# Altium footprint library 3.22-杂项.PcbLib: 985 footprints (part 39 of 64)
Each footprint in its own frame and in the unit in brackets; x right, y up, seen from the top. Pads: shape width x height; smd on the part's side, far side on the other; paste and mask are expansions set on the pad; w line width, h text height; cw(c..) or ccw(c..) is an arc to the next point about the centre after c.
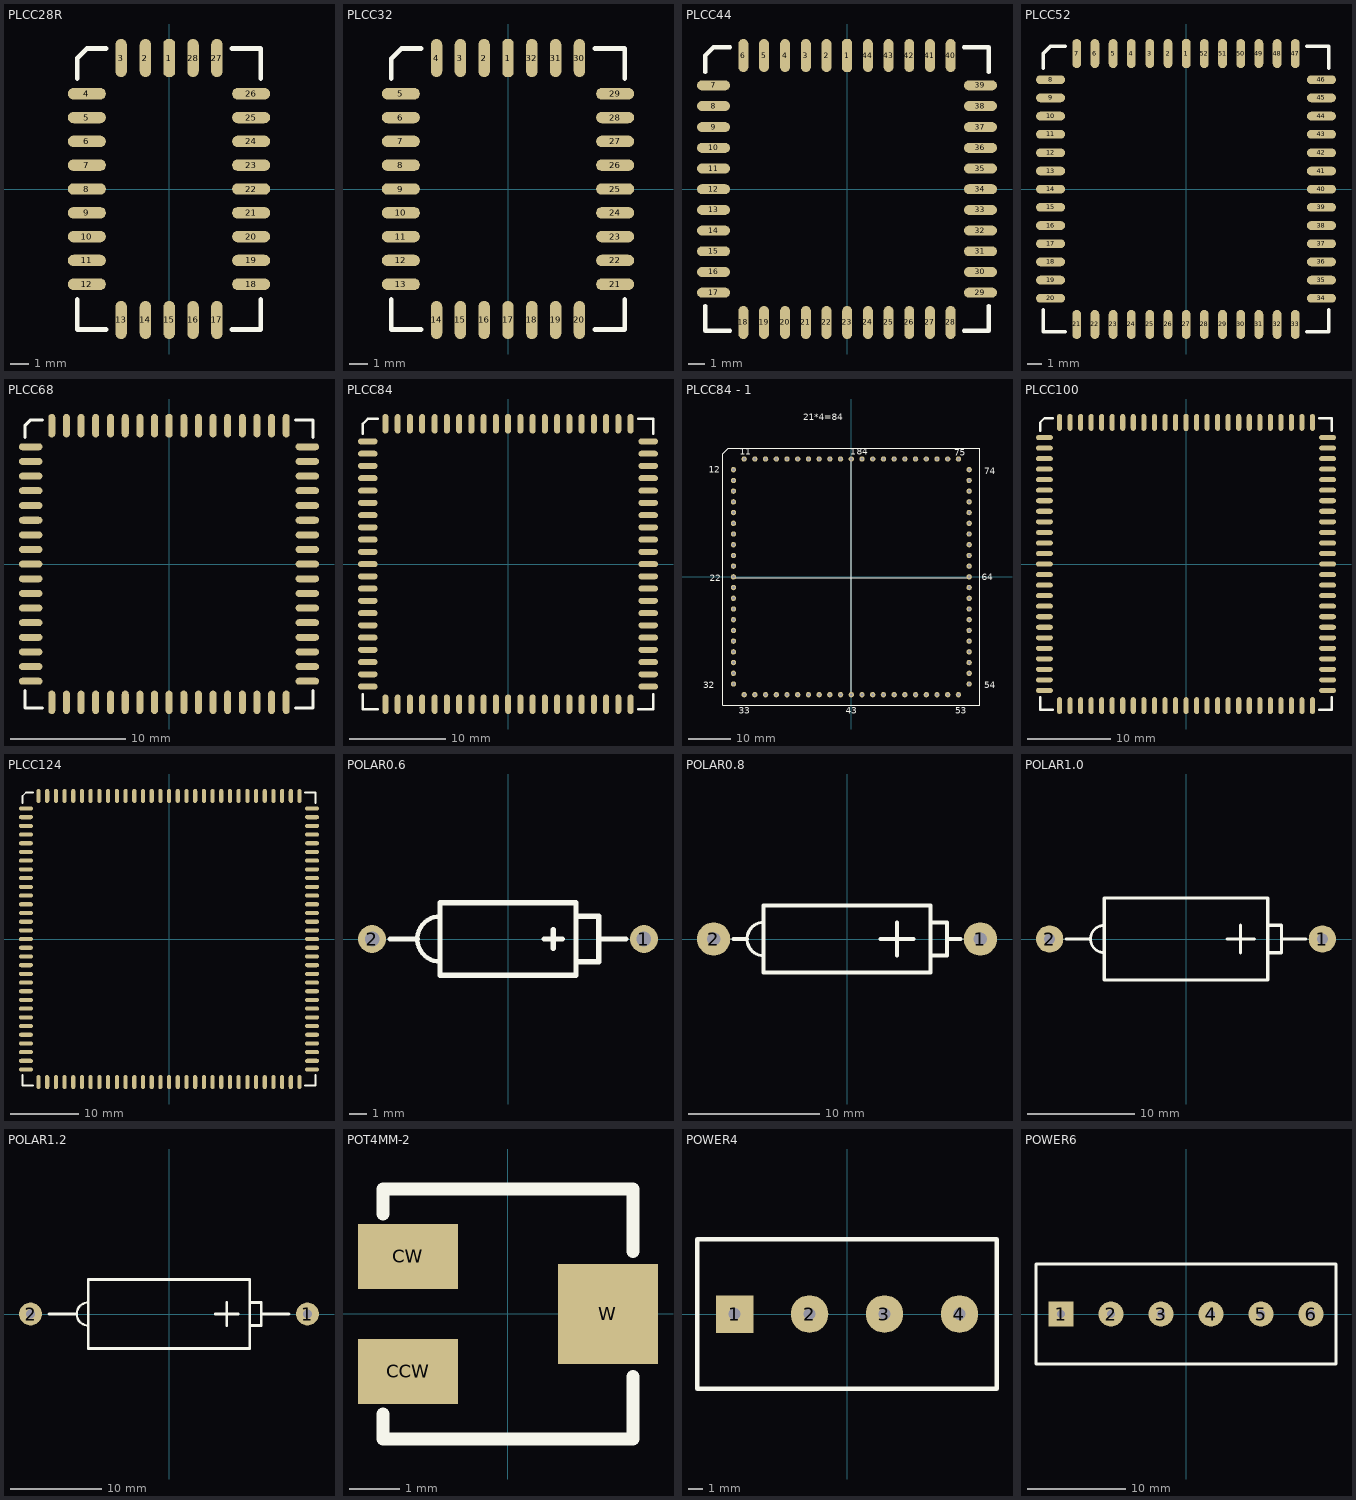
[diagram p38: the footprints below, top view; thin cyan lines are the x and y axes]

## PLCC28R [mil]
pads (28):
  oct 24x80 smd: 1(0.5,275)
  oval 24x80 smd: 2(-49.5,275) 3(-100.5,275) 13(-100.5,-275) 14(-49.5,-275) 15(0.5,-275) 16(50.5,-275) 17(100.5,-275) 27(100.5,275) 28(50.5,275)
  oval 80x24 smd: 4(-172.5,200) 5(-172.5,150) 6(-172.5,100) 7(-172.5,50) 8(-172.5,0) 9(-172.5,-50) 10(-172.5,-100) 11(-172.5,-150) 12(-172.5,-200) 18(172.5,-200) 19(172.5,-150) 20(172.5,-100) 21(172.5,-50) 22(172.5,0) 23(172.5,50) 24(172.5,100) 25(172.5,150) 26(172.5,200)
Top Overlay:
  lines w10: -192.5,-232 -192.5,-295 -132.5,-295 ; -192.5,232 -192.5,275 -172.5,295 -132.5,295 ; 132.5,-295 192.5,-295 192.5,-232 ; 132.5,295 192.5,295 192.5,232

## PLCC32 [mil]
pads (32):
  oct 24x80 smd: 1(0,275)
  oval 24x80 smd: 2(-50,275) 3(-100,275) 4(-150,275) 14(-150,-275) 15(-100,-275) 16(-50,-275) 17(0,-275) 18(50,-275) 19(100,-275) 20(150,-275) 30(150,275) 31(100,275) 32(50,275)
  oval 80x24 smd: 5(-225,200) 6(-225,150) 7(-225,100) 8(-225,50) 9(-225,0) 10(-225,-50) 11(-225,-100) 12(-225,-150) 13(-225,-200) 21(225,-200) 22(225,-150) 23(225,-100) 24(225,-50) 25(225,0) 26(225,50) 27(225,100) 28(225,150) 29(225,200)
Top Overlay:
  lines w10: -245,-232 -245,-295 -182,-295 ; -245,232 -245,274 -224,295 -182,295 ; 182,-295 245,-295 245,-232 ; 182,295 245,295 245,232

## PLCC44 [mil]
pads (44):
  oct 24x80 smd: 1(0.5,322.5)
  oval 24x80 smd: 2(-49.5,322.5) 3(-99.5,322.5) 4(-149.5,322.5) 5(-200.5,322.5) 6(-250.5,322.5) 18(-250.5,-322.5) 19(-200.5,-322.5) 20(-149.5,-322.5) 21(-99.5,-322.5) 22(-49.5,-322.5) 23(0.5,-322.5) 24(50.5,-322.5) 25(100.5,-322.5) 26(150.5,-322.5) 27(200.5,-322.5) 28(250.5,-322.5) 40(250.5,322.5) 41(200.5,322.5) 42(150.5,322.5) 43(100.5,322.5) 44(50.5,322.5)
  oval 80x24 smd: 7(-322.5,250.5) 8(-322.5,200.5) 9(-322.5,149.5) 10(-322.5,99.5) 11(-322.5,49.5) 12(-322.5,-0.5) 13(-322.5,-50.5) 14(-322.5,-100.5) 15(-322.5,-150.5) 16(-322.5,-200.5) 17(-322.5,-250.5) 29(322.5,-250.5) 30(322.5,-200.5) 31(322.5,-150.5) 32(322.5,-100.5) 33(322.5,-50.5) 34(322.5,-0.5) 35(322.5,49.5) 36(322.5,99.5) 37(322.5,149.5) 38(322.5,200.5) 39(322.5,250.5)
Top Overlay:
  lines w10: -342.5,-282.5 -342.5,-342.5 -282.5,-342.5 ; -342.5,282.5 -342.5,322.5 -322.5,342.5 -282.5,342.5 ; 282.5,-342.5 342.5,-342.5 342.5,-282.5 ; 282.5,342.5 342.5,342.5 342.5,282.5

## PLCC52 [mil]
pads (52):
  oct 24x80 smd: 1(0.5,372.5)
  oval 24x80 smd: 2(-49.5,372.5) 3(-99.5,372.5) 4(-150.5,372.5) 5(-200.5,372.5) 6(-250.5,372.5) 7(-300.5,372.5) 21(-300.5,-372.5) 22(-250.5,-372.5) 23(-200.5,-372.5) 24(-150.5,-372.5) 25(-99.5,-372.5) 26(-49.5,-372.5) 27(0.5,-372.5) 28(50.5,-372.5) 29(100.5,-372.5) 30(150.5,-372.5) 31(200.5,-372.5) 32(250.5,-372.5) 33(300.5,-372.5) 47(300.5,372.5) 48(250.5,372.5) 49(200.5,372.5) 50(150.5,372.5) 51(100.5,372.5) 52(50.5,372.5)
  oval 80x24 smd: 8(-372.5,300.5) 9(-372.5,250.5) 10(-372.5,200.5) 11(-372.5,150.5) 12(-372.5,99.5) 13(-372.5,49.5) 14(-372.5,-0.5) 15(-372.5,-50.5) 16(-372.5,-100.5) 17(-372.5,-150.5) 18(-372.5,-200.5) 19(-372.5,-250.5) 20(-372.5,-300.5) 34(372.5,-300.5) 35(372.5,-250.5) 36(372.5,-200.5) 37(372.5,-150.5) 38(372.5,-100.5) 39(372.5,-50.5) 40(372.5,-0.5) 41(372.5,49.5) 42(372.5,99.5) 43(372.5,150.5) 44(372.5,200.5) 45(372.5,250.5) 46(372.5,300.5)
Top Overlay:
  lines w10: -392.5,-332.5 -392.5,-392.5 -332.5,-392.5 ; -392.5,332.5 -392.5,372.5 -372.5,392.5 -332.5,392.5 ; 332.5,-392.5 392.5,-392.5 392.5,-332.5 ; 332.5,392.5 392.5,392.5 392.5,332.5

## PLCC68 [mil]
pads (68):
  oct 24x80 smd: 1(0.5,472.5)
  oval 24x80 smd: 2(-49.5,472.5) 3(-99.5,472.5) 4(-149.5,472.5) 5(-199.5,472.5) 6(-250.5,472.5) 7(-300.5,472.5) 8(-350.5,472.5) 9(-400.5,472.5) 27(-400.5,-472.5) 28(-350.5,-472.5) 29(-300.5,-472.5) 30(-250.5,-472.5) 31(-199.5,-472.5) 32(-149.5,-472.5) 33(-99.5,-472.5) 34(-49.5,-472.5) 35(0.5,-472.5) 36(50.5,-472.5) 37(100.5,-472.5) 38(150.5,-472.5) 39(200.5,-472.5) 40(250.5,-472.5) 41(300.5,-472.5) 42(350.5,-472.5) 43(400.5,-472.5) 61(400.5,472.5) 62(350.5,472.5) 63(300.5,472.5) 64(250.5,472.5) 65(200.5,472.5) 66(150.5,472.5) 67(100.5,472.5) 68(50.5,472.5)
  oval 80x24 smd: 10(-472.5,400.5) 11(-472.5,350.5) 12(-472.5,300.5) 13(-472.5,250.5) 14(-472.5,199.5) 15(-472.5,149.5) 16(-472.5,99.5) 17(-472.5,49.5) 18(-472.5,-0.5) 19(-472.5,-50.5) 20(-472.5,-100.5) 21(-472.5,-150.5) 22(-472.5,-200.5) 23(-472.5,-250.5) 24(-472.5,-300.5) 25(-472.5,-350.5) 26(-472.5,-400.5) 44(472.5,-400.5) 45(472.5,-350.5) 46(472.5,-300.5) 47(472.5,-250.5) 48(472.5,-200.5) 49(472.5,-150.5) 50(472.5,-100.5) 51(472.5,-50.5) 52(472.5,-0.5) 53(472.5,49.5) 54(472.5,99.5) 55(472.5,149.5) 56(472.5,199.5) 57(472.5,250.5) 58(472.5,300.5) 59(472.5,350.5) 60(472.5,400.5)
Top Overlay:
  lines w10: -492.5,-432.5 -492.5,-492.5 -432.5,-492.5 ; -492.5,432.5 -492.5,472.5 -472.5,492.5 -432.5,492.5 ; 432.5,-492.5 492.5,-492.5 492.5,-432.5 ; 432.5,492.5 492.5,492.5 492.5,432.5

## PLCC84 [mil]
pads (84):
  oct 24x80 smd: 1(0.5,572.5)
  oval 24x80 smd: 2(-49.5,572.5) 3(-99.5,572.5) 4(-149.5,572.5) 5(-199.5,572.5) 6(-249.5,572.5) 7(-299.5,572.5) 8(-350.5,572.5) 9(-400.5,572.5) 10(-450.5,572.5) 11(-500.5,572.5) 33(-500.5,-572.5) 34(-450.5,-572.5) 35(-400.5,-572.5) 36(-350.5,-572.5) 37(-299.5,-572.5) 38(-249.5,-572.5) 39(-199.5,-572.5) 40(-149.5,-572.5) 41(-99.5,-572.5) 42(-49.5,-572.5) 43(0.5,-572.5) 44(50.5,-572.5) 45(100.5,-572.5) 46(150.5,-572.5) 47(200.5,-572.5) 48(250.5,-572.5) 49(300.5,-572.5) 50(350.5,-572.5) 51(400.5,-572.5) 52(450.5,-572.5) 53(500.5,-572.5) 75(500.5,572.5) 76(450.5,572.5) 77(400.5,572.5) 78(350.5,572.5) 79(300.5,572.5) 80(250.5,572.5) 81(200.5,572.5) 82(150.5,572.5) 83(100.5,572.5) 84(50.5,572.5)
  oval 80x24 smd: 12(-572.5,500.5) 13(-572.5,450.5) 14(-572.5,400.5) 15(-572.5,350.5) 16(-572.5,299.5) 17(-572.5,249.5) 18(-572.5,199.5) 19(-572.5,149.5) 20(-572.5,99.5) 21(-572.5,49.5) 22(-572.5,-0.5) 23(-572.5,-50.5) 24(-572.5,-100.5) 25(-572.5,-150.5) 26(-572.5,-200.5) 27(-572.5,-250.5) 28(-572.5,-300.5) 29(-572.5,-350.5) 30(-572.5,-400.5) 31(-572.5,-450.5) 32(-572.5,-500.5) 54(572.5,-500.5) 55(572.5,-450.5) 56(572.5,-400.5) 57(572.5,-350.5) 58(572.5,-300.5) 59(572.5,-250.5) 60(572.5,-200.5) 61(572.5,-150.5) 62(572.5,-100.5) 63(572.5,-50.5) 64(572.5,-0.5) 65(572.5,49.5) 66(572.5,99.5) 67(572.5,149.5) 68(572.5,199.5) 69(572.5,249.5) 70(572.5,299.5) 71(572.5,350.5) 72(572.5,400.5) 73(572.5,450.5) 74(572.5,500.5)
Top Overlay:
  lines w10: -592.5,-532.5 -592.5,-592.5 -532.5,-592.5 ; -592.5,532.5 -592.5,572.5 -572.5,592.5 -532.5,592.5 ; 532.5,-592.5 592.5,-592.5 592.5,-532.5 ; 532.5,592.5 592.5,592.5 592.5,532.5

## PLCC84 - 1 [mil] "PLCC84脚芯片"
pads (84):
  round 50 hole 25: 1(0,-1100) 1(0,1100) 1(1000,-1100) 1(1000,1100) 1(1100,-1000) 1(1100,0) 2(-100,-1100) 2(-100,1100) 2(900,-1100) 2(900,1100) 2(1100,-900) 2(1100,100) 3(-200,-1100) 3(-200,1100) 3(800,-1100) 3(800,1100) 3(1100,-800) 3(1100,200) 4(-300,-1100) 4(-300,1100) 4(700,-1100) 4(700,1100) 4(1100,-700) 4(1100,300) 5(-400,-1100) 5(-400,1100) 5(600,-1100) 5(600,1100) 5(1100,-600) 5(1100,400) 6(-500,-1100) 6(-500,1100) 6(500,-1100) 6(500,1100) 6(1100,-500) 6(1100,500) 7(-600,-1100) 7(-600,1100) 7(400,-1100) 7(400,1100) 7(1100,-400) 7(1100,600) 8(-700,-1100) 8(-700,1100) 8(300,-1100) 8(300,1100) 8(1100,-300) 8(1100,700) 9(-800,-1100) 9(-800,1100) 9(200,-1100) 9(200,1100) 9(1100,-200) 9(1100,800) 10(-900,-1100) 10(-900,1100) 10(100,-1100) 10(100,1100) 10(1100,-100) 10(1100,900) 11(-1000,-1100) 11(-1000,1100) 12(-1100,1000) 13(-1100,900) 14(-1100,800) 14(1100,1000) 15(-1100,700) 16(-1100,600) 17(-1100,500) 18(-1100,400) 19(-1100,300) 20(-1100,200) 21(-1100,100) 22(-1100,0) 23(-1100,-100) 24(-1100,-200) 25(-1100,-300) 26(-1100,-400) 27(-1100,-500) 28(-1100,-600) 29(-1100,-700) 30(-1100,-800) 31(-1100,-900) 32(-1100,-1000)
Top Overlay:
  lines w10: -1100,-10 1100,-10 ; 0,-1100 0,1100 ; -1200,-1200 -1200,1150 -1150,1200 1200,1200 1200,-1200 -1200,-1200
  text "64" at 1220,-30 h60
  text "43" at -50,-1280 h60
  text "22" at -1320,-40 h60
  text "84" at 50,1140 h60
  text "75" at 960,1130 h60
  text "74" at 1240,960 h60
  text "54" at 1240,-1040 h60
  text "53" at 970,-1280 h60
  text "33" at -1050,-1280 h60
  text "1" at -10,1140 h60
  text "11" at -1040,1140 h60
  text "12" at -1330,970 h60
  text "32" at -1380,-1040 h60
  text "21*4=84" at -450,1460 h60

## PLCC100 [mil]
pads (100):
  oct 24x80 smd: 1(0.5,672.5)
  oval 24x80 smd: 2(-49.5,672.5) 3(-99.5,672.5) 4(-149.5,672.5) 5(-200.5,672.5) 6(-250.5,672.5) 7(-300.5,672.5) 8(-350.5,672.5) 9(-400.5,672.5) 10(-450.5,672.5) 11(-500.5,672.5) 12(-550.5,672.5) 13(-600.5,672.5) 39(-600.5,-672.5) 40(-550.5,-672.5) 41(-500.5,-672.5) 42(-450.5,-672.5) 43(-400.5,-672.5) 44(-350.5,-672.5) 45(-300.5,-672.5) 46(-250.5,-672.5) 47(-200.5,-672.5) 48(-149.5,-672.5) 49(-99.5,-672.5) 50(-49.5,-672.5) 51(0.5,-672.5) 52(50.5,-672.5) 53(100.5,-672.5) 54(150.5,-672.5) 55(200.5,-672.5) 56(250.5,-672.5) 57(300.5,-672.5) 58(350.5,-672.5) 59(400.5,-672.5) 60(450.5,-672.5) 61(500.5,-672.5) 62(550.5,-672.5) 63(600.5,-672.5) 89(600.5,672.5) 90(550.5,672.5) 91(500.5,672.5) 92(450.5,672.5) 93(400.5,672.5) 94(350.5,672.5) 95(300.5,672.5) 96(250.5,672.5) 97(200.5,672.5) 98(150.5,672.5) 99(100.5,672.5) 100(50.5,672.5)
  oval 80x24 smd: 14(-672.5,600.5) 15(-672.5,550.5) 16(-672.5,500.5) 17(-672.5,450.5) 18(-672.5,400.5) 19(-672.5,350.5) 20(-672.5,300.5) 21(-672.5,250.5) 22(-672.5,200.5) 23(-672.5,149.5) 24(-672.5,99.5) 25(-672.5,49.5) 26(-672.5,-0.5) 27(-672.5,-50.5) 28(-672.5,-100.5) 29(-672.5,-150.5) 30(-672.5,-200.5) 31(-672.5,-250.5) 32(-672.5,-300.5) 33(-672.5,-350.5) 34(-672.5,-400.5) 35(-672.5,-450.5) 36(-672.5,-500.5) 37(-672.5,-550.5) 38(-672.5,-600.5) 64(672.5,-600.5) 65(672.5,-550.5) 66(672.5,-500.5) 67(672.5,-450.5) 68(672.5,-400.5) 69(672.5,-350.5) 70(672.5,-300.5) 71(672.5,-250.5) 72(672.5,-200.5) 73(672.5,-150.5) 74(672.5,-100.5) 75(672.5,-50.5) 76(672.5,-0.5) 77(672.5,49.5) 78(672.5,99.5) 79(672.5,149.5) 80(672.5,200.5) 81(672.5,250.5) 82(672.5,300.5) 83(672.5,350.5) 84(672.5,400.5) 85(672.5,450.5) 86(672.5,500.5) 87(672.5,550.5) 88(672.5,600.5)
Top Overlay:
  lines w10: -692.5,-632.5 -692.5,-692.5 -632.5,-692.5 ; -692.5,632.5 -692.5,672.5 -672.5,692.5 -632.5,692.5 ; 632.5,-692.5 692.5,-692.5 692.5,-632.5 ; 632.5,692.5 692.5,692.5 692.5,632.5

## PLCC124 [mil]
pads (124):
  oct 24x80 smd: 1(0.5,822.5)
  oval 24x80 smd: 2(-49.5,822.5) 3(-99.5,822.5) 4(-149.5,822.5) 5(-199.5,822.5) 6(-249.5,822.5) 7(-299.5,822.5) 8(-350.5,822.5) 9(-400.5,822.5) 10(-450.5,822.5) 11(-500.5,822.5) 12(-550.5,822.5) 13(-600.5,822.5) 14(-650.5,822.5) 15(-700.5,822.5) 16(-750.5,822.5) 48(-750.5,-822.5) 49(-700.5,-822.5) 50(-650.5,-822.5) 51(-600.5,-822.5) 52(-550.5,-822.5) 53(-500.5,-822.5) 54(-450.5,-822.5) 55(-400.5,-822.5) 56(-350.5,-822.5) 57(-299.5,-822.5) 58(-249.5,-822.5) 59(-199.5,-822.5) 60(-149.5,-822.5) 61(-99.5,-822.5) 62(-49.5,-822.5) 63(0.5,-822.5) 64(50.5,-822.5) 65(100.5,-822.5) 66(150.5,-822.5) 67(200.5,-822.5) 68(250.5,-822.5) 69(300.5,-822.5) 70(350.5,-822.5) 71(400.5,-822.5) 72(450.5,-822.5) 73(500.5,-822.5) 74(550.5,-822.5) 75(600.5,-822.5) 76(650.5,-822.5) 77(700.5,-822.5) 78(750.5,-822.5) 110(750.5,822.5) 111(700.5,822.5) 112(650.5,822.5) 113(600.5,822.5) 114(550.5,822.5) 115(500.5,822.5) 116(450.5,822.5) 117(400.5,822.5) 118(350.5,822.5) 119(300.5,822.5) 120(250.5,822.5) 121(200.5,822.5) 122(150.5,822.5) 123(100.5,822.5) 124(50.5,822.5)
  oval 80x24 smd: 17(-822.5,750.5) 18(-822.5,700.5) 19(-822.5,650.5) 20(-822.5,600.5) 21(-822.5,550.5) 22(-822.5,500.5) 23(-822.5,450.5) 24(-822.5,400.5) 25(-822.5,350.5) 26(-822.5,299.5) 27(-822.5,249.5) 28(-822.5,199.5) 29(-822.5,149.5) 30(-822.5,99.5) 31(-822.5,49.5) 32(-822.5,-0.5) 33(-822.5,-50.5) 34(-822.5,-100.5) 35(-822.5,-150.5) 36(-822.5,-200.5) 37(-822.5,-250.5) 38(-822.5,-300.5) 39(-822.5,-350.5) 40(-822.5,-400.5) 41(-822.5,-450.5) 42(-822.5,-500.5) 43(-822.5,-550.5) 44(-822.5,-600.5) 45(-822.5,-650.5) 46(-822.5,-700.5) 47(-822.5,-750.5) 79(822.5,-750.5) 80(822.5,-700.5) 81(822.5,-650.5) 82(822.5,-600.5) 83(822.5,-550.5) 84(822.5,-500.5) 85(822.5,-450.5) 86(822.5,-400.5) 87(822.5,-350.5) 88(822.5,-300.5) 89(822.5,-250.5) 90(822.5,-200.5) 91(822.5,-150.5) 92(822.5,-100.5) 93(822.5,-50.5) 94(822.5,-0.5) 95(822.5,49.5) 96(822.5,99.5) 97(822.5,149.5) 98(822.5,199.5) 99(822.5,249.5) 100(822.5,299.5) 101(822.5,350.5) 102(822.5,400.5) 103(822.5,450.5) 104(822.5,500.5) 105(822.5,550.5) 106(822.5,600.5) 107(822.5,650.5) 108(822.5,700.5) 109(822.5,750.5)
Top Overlay:
  lines w10: -842.5,-782.5 -842.5,-842.5 -782.5,-842.5 ; -842.5,782.5 -842.5,822.5 -822.5,842.5 -782.5,842.5 ; 782.5,-842.5 842.5,-842.5 842.5,-782.5 ; 782.5,842.5 842.5,842.5 842.5,782.5

## POLAR0.6 [mil]
pads (2):
  round 62 hole 32: 1(300,0) 2(-300,0)
Top Overlay:
  lines w10: -150,-50 cw(c-150,0) -150,50
  lines w12: -260,0 -200,0 ; 80,0 120,0 ; 100,-20 100,20 ; 150,-50 200,-50 200,50 150,50 ; 200,0 260,0 ; -150,-80 -150,80 150,80 150,-80 -150,-80

## POLAR0.8 [mil]
pads (2):
  round 100 hole 40: 1(400,0) 2(-400,0)
Top Overlay:
  lines w10: -250,-50 cw(c-250,0) -250,50
  lines w12: -340,0 -300,0 ; 100,0 200,0 ; 150,-50 150,50 ; 250,-50 300,-50 300,50 250,50 ; 300,0 340,0 ; -250,-100 -250,100 250,100 250,-100 -250,-100

## POLAR1.0 [mil]
pads (2):
  round 100 hole 40: 1(500,0) 2(-500,0)
Top Overlay:
  lines w10: -300,-50 cw(c-300,0) -300,50
  lines w12: -440,0 -350,0 ; 150,0 250,0 ; 200,-50 200,50 ; 300,-50 350,-50 350,50 300,50 ; 350,0 440,0 ; -300,-150 300,-150 300,150 -300,150 -300,-150

## POLAR1.2 [mil]
pads (2):
  round 100 hole 40: 1(600,0) 2(-600,0)
Top Overlay:
  lines w10: -350,-50 cw(c-350,0) -350,50
  lines w12: -520,0 -400,0 ; 200,0 300,0 ; 250,-50 250,50 ; 350,-50 400,-50 400,50 350,50 ; 400,0 520,0 ; -350,-150 -350,150 350,150 350,-150 -350,-150

## POT4MM-2 [mm] "Square Trimming Potentiometer"
pads (3):
  rect 2x1.3 smd: CCW(-2,-1.15) CW(-2,1.15)
  rect 2x2 smd: W(2,0)
Top Overlay:
  lines w0.254: -2.5,-2 -2.5,-2.5 2.5,-2.5 2.5,-1.25 ; -2.5,2 -2.5,2.5 2.5,2.5 2.5,1.25

## POWER4 [mil]
pads (4):
  rect 100x100 hole 32: 1(-300,0)
  round 100 hole 32: 2(-100,0) 3(100,0) 4(300,0)
Top Overlay:
  lines w12: -400,-200 400,-200 400,200 -400,200 -400,-200

## POWER6 [mil]
pads (6):
  rect 100x100 hole 32: 1(-500,0)
  round 100 hole 32: 2(-300,0) 3(-100,0) 4(100,0) 5(300,0) 6(500,0)
Top Overlay:
  lines w12: -600,-200 -600,200 600,200 600,-200 -600,-200